# Altium footprint library 430 integreted.PcbLib: 281 footprints (part 5 of 18)
Each footprint in its own frame and in the unit in brackets; x right, y up, seen from the top. Pads: shape width x height; smd on the part's side, far side on the other; paste and mask are expansions set on the pad; w line width, h text height; cw(c..) or ccw(c..) is an arc to the next point about the centre after c.
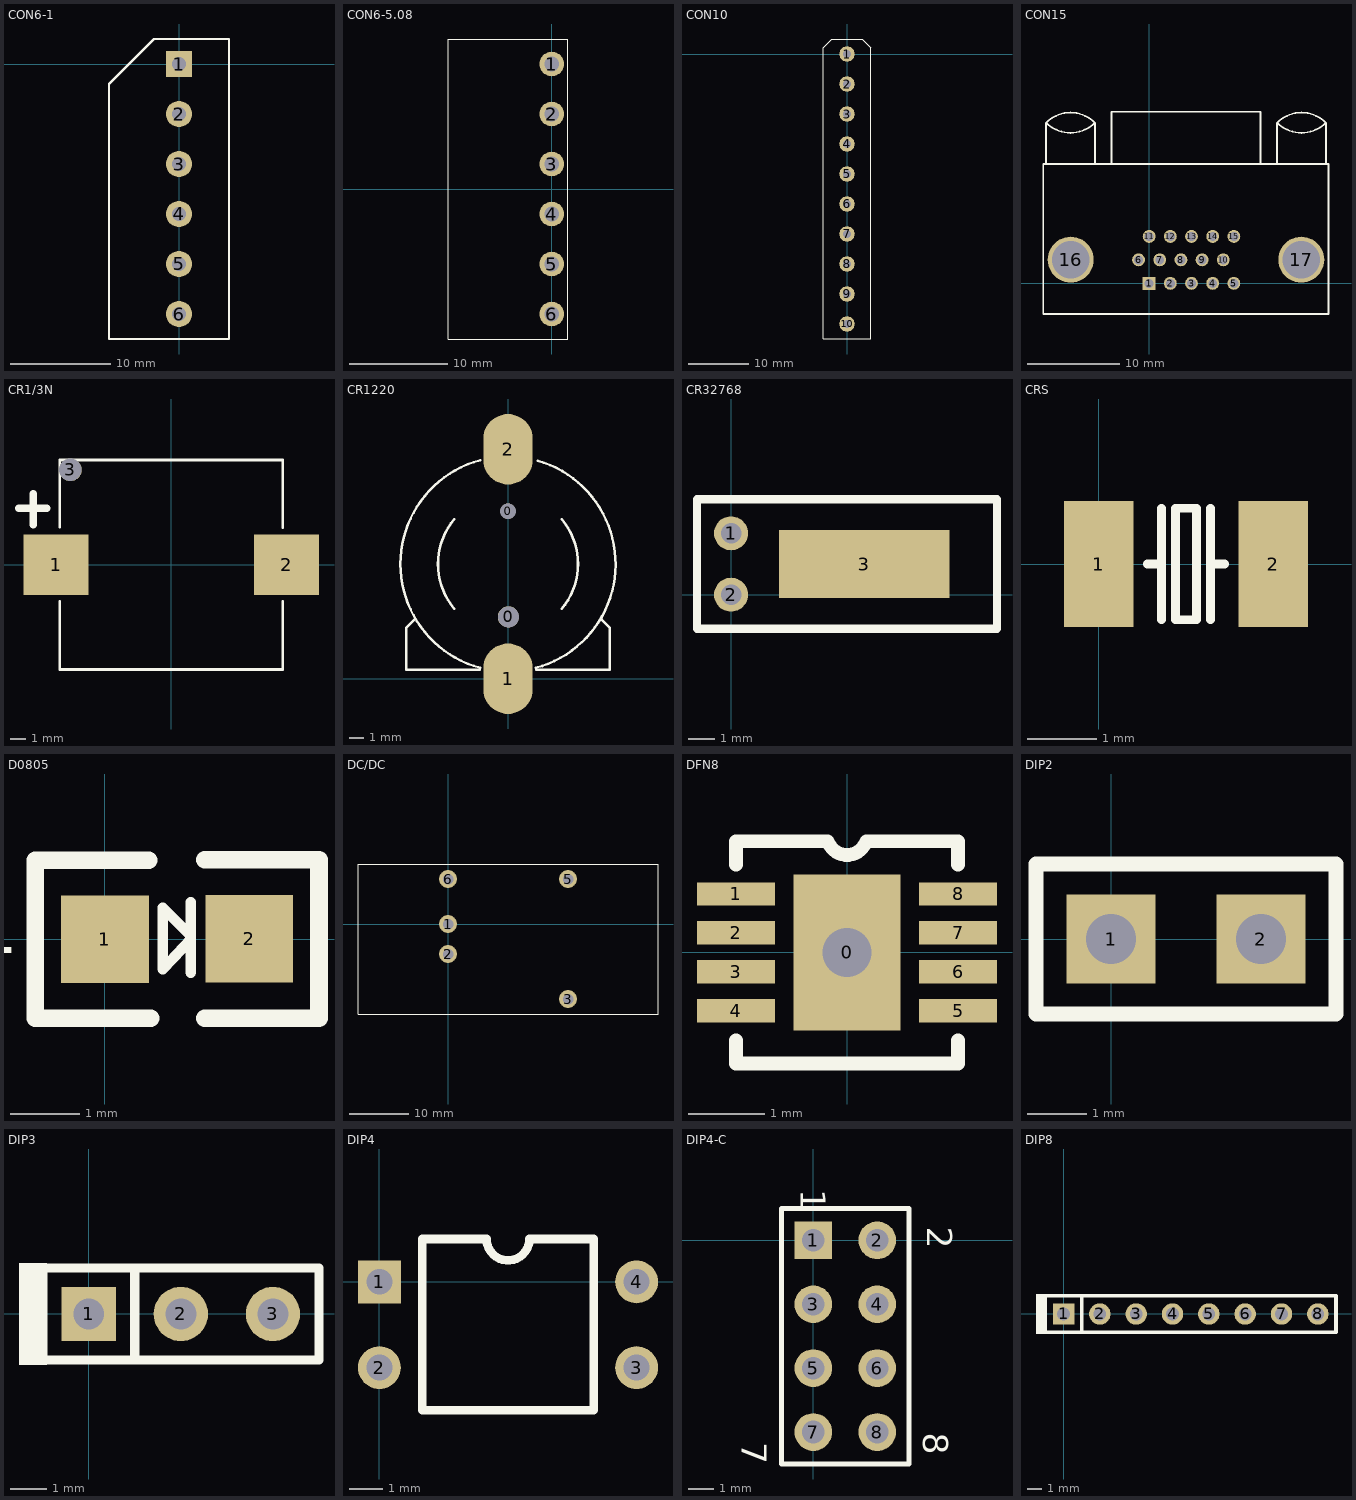
[diagram p4: the footprints below, top view; thin cyan lines are the x and y axes]

## CON6-1 [mm]
pads (6):
  rect 2.6x2.6 hole 1.4: 1(0,0)
  round 2.6 hole 1.4: 2(0,-5) 3(0,-10) 4(0,-15) 5(0,-20) 6(0,-25)
Top Overlay:
  lines w0.203: -7,-27.5 -7,-2 -2.5,2.5 5,2.5 5,-27.5 -7,-27.5

## CON6-5.08 [mm]
pads (6):
  round 2.5 hole 1.5: 1(0,12.7) 2(0,7.62) 3(0,2.54) 4(0,-2.54) 5(0,-7.62) 6(0,-12.7)
Top Overlay:
  lines w0.127: -10.5,-15.24 -10.5,15.24 1.6,15.24 1.6,-15.24 -10.5,-15.24
3D body: height 8.6, standoff -3.5, extent -9.989,-15.215 2.013,15.265

## CON10 [mm]
pads (10):
  round 2.6 hole 1.3: 1(0,0) 2(0,-5) 3(0,-10) 4(0,-15) 5(0,-20) 6(0,-25) 7(0,-30) 8(0,-35) 9(0,-40) 10(0,-45)
Top Overlay:
  lines w0.203: -4,-47.5 -4,1 -2.5,2.5 2.5,2.5 4,1 4,-47.5 -4,-47.5

## CON15 [mil]
pads (17):
  rect 55x55 hole 38: 1(0,0)
  round 55 hole 38: 2(90.55,0) 3(181.1,0) 4(271.65,0) 5(362.2,0) 6(-45.27,100.39) 7(45.28,100.39) 8(135.83,100.39) 9(226.38,100.39) 10(316.93,100.39) 11(0,200.79) 12(90.55,200.79) 13(181.1,200.79) 14(271.65,200.79) 15(362.2,200.79)
  round 196.85 hole 160: 16(-335.52,101.18) 17(650.48,101.18)
Top Overlay:
  lines w7.87: -452.76,-131.89 -452.76,509.65 767.72,509.65 ; -440.83,509.65 -440.83,686.81 ; -232.17,509.65 -232.17,686.81 ; -161.31,509.65 -161.31,734.06 476.49,734.06 476.49,509.65 ; 547.13,509.65 547.13,686.81 ; 755.8,509.65 755.8,686.81 ; -440.83,686.81 cw(c-336.5,582.48) -232.17,686.81 ; -440.83,686.81 ccw(c-336.5,791.14) -232.17,686.81 ; 547.13,686.81 cw(c651.46,582.48) 755.8,686.81 ; 547.13,686.81 ccw(c651.46,791.14) 755.8,686.81
  lines w8: -452.76,-131.89 767.72,-131.89 767.72,509.65

## CR1/3N [mm]
pads (3):
  rect 4.3x4 smd: 1(-7.65,0) 2(7.65,0)
  round 1.5 hole 1.5: 3(-6.7,6.3)
Top Overlay:
  lines w0.178: -7.4,-6.95 7.4,-6.95 7.4,-2.438 ; -7.4,-6.934 -7.4,-2.413 ; -7.4,2.489 -7.4,6.934 ; -7.4,6.95 7.4,6.95 ; 7.4,2.464 7.4,6.934
  lines w0.508: -10.109,3.759 -8.28,3.759 ; -9.169,2.667 -9.169,4.699

## CR1220 [mm]
pads (4):
  round 1.1 hole 1.1: 0(0,11.878)
  round 1.5 hole 1.5: 0(0.025,4.378)
  oval 3.5x5 smd: 1(0,0) 2(0,16.256)
Top Overlay:
  lines w0.178: -6.6,4.228 -7.2,3.628 -7.2,0.628 -2,0.628 ; -3.815,4.959 cw(c0,8.128) -3.812,11.3 ; -1.963,0.765 cw(c0,8.128) -7.62,8.128 cw(c0,8.128) -1.963,15.491 ; 1.963,0.765 ccw(c0,8.128) 2.093,15.455 ; 2,0.628 7.2,0.628 7.2,3.628 6.625,4.203 ; 3.81,4.953 ccw(c0,8.128) 3.812,11.3
3D body: height 4.94, standoff 0, extent -7.493,-1.351 7.504,17.149

## CR32768 [mil]
pads (3):
  round 50 hole 30: 1(0.04,89.96) 2(0.04,-0.04)
  rect 250x100 smd: 3(195.04,44.96)
Top Overlay:
  lines w12: -49.96,-50.04 -49.96,139.96 390.04,139.96 390.04,-50.04 -49.96,-50.04

## CRS [mm]
pads (2):
  rect 1x1.8 smd: 1(0,0) 2(2.5,0)
Top Overlay:
  lines w0.127: 0.7,0 0.9,0 ; 0.9,-0.8 0.9,0.8 ; 1.6,-0.8 1.6,0.8 ; 1.6,0 1.8,0 ; 1.1,-0.8 1.4,-0.8 1.4,0.8 1.1,0.8 1.1,-0.8

## D0805 [mm]
pads (2):
  rect 1.27x1.27 smd: 1(0,0) 2(2.09,0.005)
Top Overlay:
  lines w0.152: 1.245,-0.483 1.245,0.533 ; 1.245,0 0.838,-0.432 0.838,0.457 1.245,0.051
  lines w0.254: 0.635,1.143 -1.011,1.143 -1.011,-1.143 0.66,-1.143 ; 1.448,-1.143 3.099,-1.143 3.099,1.148 1.448,1.148
  text "+" at -1.245,-0.483 h0.76
3D body: height 0.46, standoff 0, extent 0.838,-0.279 1.373,0.279
3D body: height 0.38, standoff 0, extent 0.404,-0.635 1.807,0.635
3D body: height 0.38, standoff 0, extent -0.009,-0.635 0.416,0.635
3D body: height 0.38, standoff 0, extent 1.794,-0.635 2.219,0.635

## DC/DC [mil]
pads (5):
  round 120 hole 70: 1(0,0) 2(0,-200) 3(800,-500) 5(800,300) 6(0,300)
Top Overlay:
  lines w5: -600,-600 -600,400 1400,400 1400,-600 -600,-600

## DFN8 [mil]
pads (9):
  rect 55x80 hole 25: 0(0,0)
  rect 40x12 smd: 1(-57,30) 2(-57,10) 3(-57,-10) 4(-57,-30) 5(57,-30) 6(57,-10) 7(57,10) 8(57,30)
Top Overlay:
  lines w7: -9.81,56.96 ccw(c0,60.39) 9.81,56.96
  lines w7.01: -57,-45 -57,-57 57,-57 57,-45 ; -57,45 -57,57 -10,57 ; 10,57 57,57 57,45

## DIP2 [mm]
pads (2):
  rect 1.5x1.5 hole 0.85: 1(0,0) 2(2.54,0)
Top Overlay:
  lines w0.254: -1.27,-1.27 -1.27,1.27 3.81,1.27 3.81,-1.27 -1.27,-1.27

## DIP3 [mm]
pads (3):
  rect 1.5x1.5 hole 0.85: 1(0,0)
  round 1.5 hole 0.85: 2(2.54,0) 3(5.08,0)
Top Overlay:
  rectangle: -1.925,-1.4 -1.15,1.4
  lines w0.254: 1.27,-1.27 1.27,1.27 ; -1.27,-1.27 -1.27,1.27 6.35,1.27 6.35,-1.27 -1.27,-1.27

## DIP4 [mil]
pads (4):
  rect 50x50 hole 30: 1(0,0)
  round 50 hole 30: 2(0,-100) 3(300,-100) 4(300,0)
Top Overlay:
  lines w10: 50,-150 50,50 125,50 ccw(c150,50) 175,50 250,50 250,-150 50,-150

## DIP4-C [mm]
pads (8):
  rect 1.5x1.5 hole 0.9: 1(0,0)
  round 1.5 hole 0.9: 2(2.54,0) 3(0,-2.54) 4(2.54,-2.54) 5(0,-5.08) 6(2.54,-5.08) 7(0,-7.62) 8(2.54,-7.62)
Top Overlay:
  lines w0.2: -1.27,-8.89 3.81,-8.89 3.81,1.27 -1.27,1.27 -1.27,-8.89
  text "8" at 4.369,-7.645 h1
  text "7" at -2.845,-8.026 h1
  text "1" at -0.508,2.032 h1
  text "2" at 4.521,0.533 h1

## DIP8 [mm]
pads (8):
  rect 1.5x1.5 hole 0.889: 1(0,0)
  round 1.5 hole 0.889: 2(2.54,0) 3(5.08,0) 4(7.62,0) 5(10.16,0) 6(12.7,0) 7(15.24,0) 8(17.78,0)
Top Overlay:
  rectangle: -1.925,-1.4 -1.15,1.4
  lines w0.254: 1.27,-1.27 1.27,1.27 ; -1.27,-1.27 -1.27,1.27 19.05,1.27 19.05,-1.27 -1.27,-1.27